# Altium integrated library WCAP-ATG5_rev15a.intlib: 201 symbols (part 3 of 3)
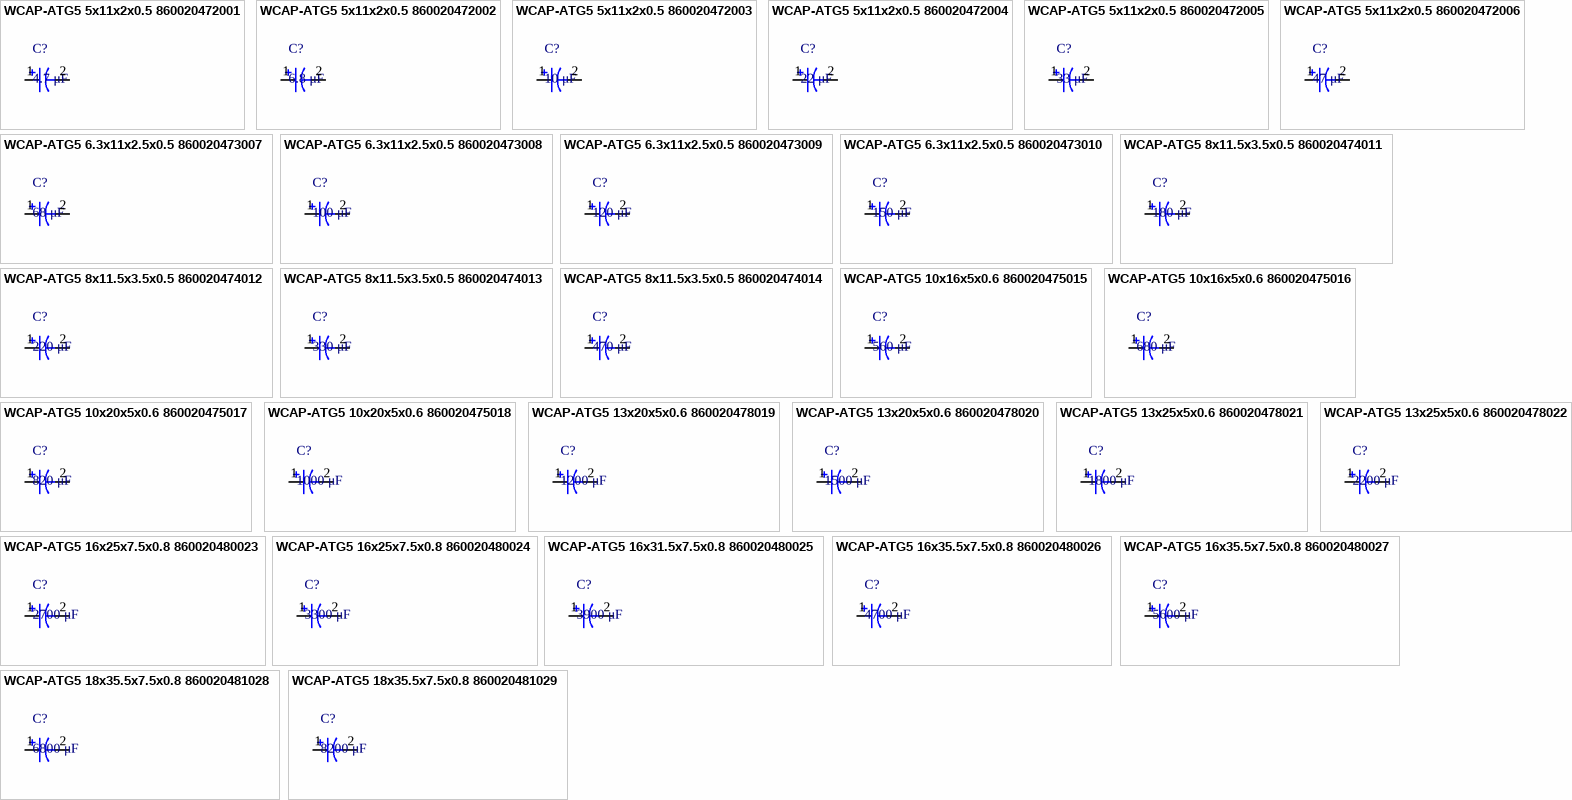
[diagram p8: symbols WCAP-ATG5 5x11x2x0.5 860020472001 to WCAP-ATG5 18x35.5x7.5x0.8 860020481029]

## WCAP-ATG5 6.3x11x2.5x0.5 860020473010
designator C?, comment 150 μF
WCAP-ATG5 Aluminum Electrolytic Capacitors , 150 μF; + / - 20%; 25 V , 6,3 x 11; Manufacturer: Wurth Elektronik; partNo: 860020473010; E-mail: libraries@we-online.com; Characteristics: Aluminum Electrolytic Capacitor; Recommended soldering: Wave; Operating temperature:–40 °C to +105 °C for UR < 400 V; –25 °C to +105 °C for UR ≥ 400 V; General purpose product series with max. temperature of +105 °C; Load life: 2000 h @ +105 °C; ComponentLink1Description: Manufacturer; ComponentLink1URL: http://www.we-online.com; ComponentLink2Description: Datasheet; ComponentLink2URL: http://katalog.we-online.de/pbs/datasheet/860020473010.pdf; Created by: Karrer Zheng; Created Date: 6/8/2015; Capacitance: 150 μF; Application: Medium and high voltage type range from 160V-450V used as primary side input filter in power supply; Low voltage type used as energy storage or low frequency filtering in circuit, applied to general switching power supply, AC-DC converter, adapter, charger, TV, VCR, DC motor circuit filter, digital audio, digital cameras, digital video cameras, satellite receiver etc.
footprint WCAP-ATG5 6.3x11x2.5x0.5
pins: 1, 2

## WCAP-ATG5 8x11.5x3.5x0.5 860020474011
designator C?, comment 180 μF
WCAP-ATG5 Aluminum Electrolytic Capacitors , 180 μF; + / - 20%; 25 V , 8 x 11,5; Manufacturer: Wurth Elektronik; partNo: 860020474011; E-mail: libraries@we-online.com; Characteristics: Aluminum Electrolytic Capacitor; Recommended soldering: Wave; Operating temperature:–40 °C to +105 °C for UR < 400 V; –25 °C to +105 °C for UR ≥ 400 V; General purpose product series with max. temperature of +105 °C; Load life: 2000 h @ +105 °C; ComponentLink1Description: Manufacturer; ComponentLink1URL: http://www.we-online.com; ComponentLink2Description: Datasheet; ComponentLink2URL: http://katalog.we-online.de/pbs/datasheet/860020474011.pdf; Created by: Karrer Zheng; Created Date: 6/8/2015; Capacitance: 180 μF; Application: Medium and high voltage type range from 160V-450V used as primary side input filter in power supply; Low voltage type used as energy storage or low frequency filtering in circuit, applied to general switching power supply, AC-DC converter, adapter, charger, TV, VCR, DC motor circuit filter, digital audio, digital cameras, digital video cameras, satellite receiver etc.
footprint WCAP-ATG5 8x11.5x3.5x0.5
pins: 1, 2

## WCAP-ATG5 8x11.5x3.5x0.5 860020474012
designator C?, comment 220 μF
WCAP-ATG5 Aluminum Electrolytic Capacitors , 220 μF; + / - 20%; 25 V , 8 x 11,5; Manufacturer: Wurth Elektronik; partNo: 860020474012; E-mail: libraries@we-online.com; Characteristics: Aluminum Electrolytic Capacitor; Recommended soldering: Wave; Operating temperature:–40 °C to +105 °C for UR < 400 V; –25 °C to +105 °C for UR ≥ 400 V; General purpose product series with max. temperature of +105 °C; Load life: 2000 h @ +105 °C; ComponentLink1Description: Manufacturer; ComponentLink1URL: http://www.we-online.com; ComponentLink2Description: Datasheet; ComponentLink2URL: http://katalog.we-online.de/pbs/datasheet/860020474012.pdf; Created by: Karrer Zheng; Created Date: 6/8/2015; Capacitance: 220 μF; Application: Medium and high voltage type range from 160V-450V used as primary side input filter in power supply; Low voltage type used as energy storage or low frequency filtering in circuit, applied to general switching power supply, AC-DC converter, adapter, charger, TV, VCR, DC motor circuit filter, digital audio, digital cameras, digital video cameras, satellite receiver etc.
footprint WCAP-ATG5 8x11.5x3.5x0.5
pins: 1, 2

## WCAP-ATG5 8x11.5x3.5x0.5 860020474013
designator C?, comment 330 μF
WCAP-ATG5 Aluminum Electrolytic Capacitors , 330 μF; + / - 20%; 25 V , 8 x 11,5; Manufacturer: Wurth Elektronik; partNo: 860020474013; E-mail: libraries@we-online.com; Characteristics: Aluminum Electrolytic Capacitor; Recommended soldering: Wave; Operating temperature:–40 °C to +105 °C for UR < 400 V; –25 °C to +105 °C for UR ≥ 400 V; General purpose product series with max. temperature of +105 °C; Load life: 2000 h @ +105 °C; ComponentLink1Description: Manufacturer; ComponentLink1URL: http://www.we-online.com; ComponentLink2Description: Datasheet; ComponentLink2URL: http://katalog.we-online.de/pbs/datasheet/860020474013.pdf; Created by: Karrer Zheng; Created Date: 6/8/2015; Capacitance: 330 μF; Application: Medium and high voltage type range from 160V-450V used as primary side input filter in power supply; Low voltage type used as energy storage or low frequency filtering in circuit, applied to general switching power supply, AC-DC converter, adapter, charger, TV, VCR, DC motor circuit filter, digital audio, digital cameras, digital video cameras, satellite receiver etc.
footprint WCAP-ATG5 8x11.5x3.5x0.5
pins: 1, 2

## WCAP-ATG5 8x11.5x3.5x0.5 860020474014
designator C?, comment 470 μF
WCAP-ATG5 Aluminum Electrolytic Capacitors , 470 μF; + / - 20%; 25 V , 8 x 11,5; Manufacturer: Wurth Elektronik; partNo: 860020474014; E-mail: libraries@we-online.com; Characteristics: Aluminum Electrolytic Capacitor; Recommended soldering: Wave; Operating temperature:–40 °C to +105 °C for UR < 400 V; –25 °C to +105 °C for UR ≥ 400 V; General purpose product series with max. temperature of +105 °C; Load life: 2000 h @ +105 °C; ComponentLink1Description: Manufacturer; ComponentLink1URL: http://www.we-online.com; ComponentLink2Description: Datasheet; ComponentLink2URL: http://katalog.we-online.de/pbs/datasheet/860020474014.pdf; Created by: Karrer Zheng; Created Date: 6/8/2015; Capacitance: 470 μF; Application: Medium and high voltage type range from 160V-450V used as primary side input filter in power supply; Low voltage type used as energy storage or low frequency filtering in circuit, applied to general switching power supply, AC-DC converter, adapter, charger, TV, VCR, DC motor circuit filter, digital audio, digital cameras, digital video cameras, satellite receiver etc.
footprint WCAP-ATG5 8x11.5x3.5x0.5
pins: 1, 2

## WCAP-ATG5 10x16x5x0.6 860020475015
designator C?, comment 560 μF
WCAP-ATG5 Aluminum Electrolytic Capacitors , 560 μF; + / - 20%; 25 V , 10 x 16; Manufacturer: Wurth Elektronik; partNo: 860020475015; E-mail: libraries@we-online.com; Characteristics: Aluminum Electrolytic Capacitor; Recommended soldering: Wave; Operating temperature:–40 °C to +105 °C for UR < 400 V; –25 °C to +105 °C for UR ≥ 400 V; General purpose product series with max. temperature of +105 °C; Load life: 2000 h @ +105 °C; ComponentLink1Description: Manufacturer; ComponentLink1URL: http://www.we-online.com; ComponentLink2Description: Datasheet; ComponentLink2URL: http://katalog.we-online.de/pbs/datasheet/860020475015.pdf; Created by: Karrer Zheng; Created Date: 6/8/2015; Capacitance: 560 μF; Application: Medium and high voltage type range from 160V-450V used as primary side input filter in power supply; Low voltage type used as energy storage or low frequency filtering in circuit, applied to general switching power supply, AC-DC converter, adapter, charger, TV, VCR, DC motor circuit filter, digital audio, digital cameras, digital video cameras, satellite receiver etc.
footprint WCAP-ATG5 10x16x5x0.6
pins: 1, 2

## WCAP-ATG5 10x16x5x0.6 860020475016
designator C?, comment 680 μF
WCAP-ATG5 Aluminum Electrolytic Capacitors , 680 μF; + / - 20%; 25 V , 10 x 16; Manufacturer: Wurth Elektronik; partNo: 860020475016; E-mail: libraries@we-online.com; Characteristics: Aluminum Electrolytic Capacitor; Recommended soldering: Wave; Operating temperature:–40 °C to +105 °C for UR < 400 V; –25 °C to +105 °C for UR ≥ 400 V; General purpose product series with max. temperature of +105 °C; Load life: 2000 h @ +105 °C; ComponentLink1Description: Manufacturer; ComponentLink1URL: http://www.we-online.com; ComponentLink2Description: Datasheet; ComponentLink2URL: http://katalog.we-online.de/pbs/datasheet/860020475016.pdf; Created by: Karrer Zheng; Created Date: 6/8/2015; Capacitance: 680 μF; Application: Medium and high voltage type range from 160V-450V used as primary side input filter in power supply; Low voltage type used as energy storage or low frequency filtering in circuit, applied to general switching power supply, AC-DC converter, adapter, charger, TV, VCR, DC motor circuit filter, digital audio, digital cameras, digital video cameras, satellite receiver etc.
footprint WCAP-ATG5 10x16x5x0.6
pins: 1, 2

## WCAP-ATG5 10x20x5x0.6 860020475017
designator C?, comment 820 μF
WCAP-ATG5 Aluminum Electrolytic Capacitors , 820 μF; + / - 20%; 25 V , 10 x 20; Manufacturer: Wurth Elektronik; partNo: 860020475017; E-mail: libraries@we-online.com; Characteristics: Aluminum Electrolytic Capacitor; Recommended soldering: Wave; Operating temperature:–40 °C to +105 °C for UR < 400 V; –25 °C to +105 °C for UR ≥ 400 V; General purpose product series with max. temperature of +105 °C; Load life: 2000 h @ +105 °C; ComponentLink1Description: Manufacturer; ComponentLink1URL: http://www.we-online.com; ComponentLink2Description: Datasheet; ComponentLink2URL: http://katalog.we-online.de/pbs/datasheet/860020475017.pdf; Created by: Karrer Zheng; Created Date: 6/8/2015; Capacitance: 820 μF; Application: Medium and high voltage type range from 160V-450V used as primary side input filter in power supply; Low voltage type used as energy storage or low frequency filtering in circuit, applied to general switching power supply, AC-DC converter, adapter, charger, TV, VCR, DC motor circuit filter, digital audio, digital cameras, digital video cameras, satellite receiver etc.
footprint WCAP-ATG5 10x20x5x0.6
pins: 1, 2

## WCAP-ATG5 10x20x5x0.6 860020475018
designator C?, comment 1000 μF
WCAP-ATG5 Aluminum Electrolytic Capacitors , 1000 μF; + / - 20%; 25 V , 10 x 20; Manufacturer: Wurth Elektronik; partNo: 860020475018; E-mail: libraries@we-online.com; Characteristics: Aluminum Electrolytic Capacitor; Recommended soldering: Wave; Operating temperature:–40 °C to +105 °C for UR < 400 V; –25 °C to +105 °C for UR ≥ 400 V; General purpose product series with max. temperature of +105 °C; Load life: 2000 h @ +105 °C; ComponentLink1Description: Manufacturer; ComponentLink1URL: http://www.we-online.com; ComponentLink2Description: Datasheet; ComponentLink2URL: http://katalog.we-online.de/pbs/datasheet/860020475018.pdf; Created by: Karrer Zheng; Created Date: 6/8/2015; Capacitance: 1000 μF; Application: Medium and high voltage type range from 160V-450V used as primary side input filter in power supply; Low voltage type used as energy storage or low frequency filtering in circuit, applied to general switching power supply, AC-DC converter, adapter, charger, TV, VCR, DC motor circuit filter, digital audio, digital cameras, digital video cameras, satellite receiver etc.
footprint WCAP-ATG5 10x20x5x0.6
pins: 1, 2

## WCAP-ATG5 13x20x5x0.6 860020478019
designator C?, comment 1200 μF
WCAP-ATG5 Aluminum Electrolytic Capacitors , 1200 μF; + / - 20%; 25 V , 13 x 20; Manufacturer: Wurth Elektronik; partNo: 860020478019; E-mail: libraries@we-online.com; Characteristics: Aluminum Electrolytic Capacitor; Recommended soldering: Wave; Operating temperature:–40 °C to +105 °C for UR < 400 V; –25 °C to +105 °C for UR ≥ 400 V; General purpose product series with max. temperature of +105 °C; Load life: 2000 h @ +105 °C; ComponentLink1Description: Manufacturer; ComponentLink1URL: http://www.we-online.com; ComponentLink2Description: Datasheet; ComponentLink2URL: http://katalog.we-online.de/pbs/datasheet/860020478019.pdf; Created by: Karrer Zheng; Created Date: 6/8/2015; Capacitance: 1200 μF; Application: Medium and high voltage type range from 160V-450V used as primary side input filter in power supply; Low voltage type used as energy storage or low frequency filtering in circuit, applied to general switching power supply, AC-DC converter, adapter, charger, TV, VCR, DC motor circuit filter, digital audio, digital cameras, digital video cameras, satellite receiver etc.
footprint WCAP-ATG5 13x20x5x0.6
pins: 1, 2

## WCAP-ATG5 13x20x5x0.6 860020478020
designator C?, comment 1500 μF
WCAP-ATG5 Aluminum Electrolytic Capacitors , 1500 μF; + / - 20%; 25 V , 13 x 20; Manufacturer: Wurth Elektronik; partNo: 860020478020; E-mail: libraries@we-online.com; Characteristics: Aluminum Electrolytic Capacitor; Recommended soldering: Wave; Operating temperature:–40 °C to +105 °C for UR < 400 V; –25 °C to +105 °C for UR ≥ 400 V; General purpose product series with max. temperature of +105 °C; Load life: 2000 h @ +105 °C; ComponentLink1Description: Manufacturer; ComponentLink1URL: http://www.we-online.com; ComponentLink2Description: Datasheet; ComponentLink2URL: http://katalog.we-online.de/pbs/datasheet/860020478020.pdf; Created by: Karrer Zheng; Created Date: 6/8/2015; Capacitance: 1500 μF; Application: Medium and high voltage type range from 160V-450V used as primary side input filter in power supply; Low voltage type used as energy storage or low frequency filtering in circuit, applied to general switching power supply, AC-DC converter, adapter, charger, TV, VCR, DC motor circuit filter, digital audio, digital cameras, digital video cameras, satellite receiver etc.
footprint WCAP-ATG5 13x20x5x0.6
pins: 1, 2

## WCAP-ATG5 13x25x5x0.6 860020478021
designator C?, comment 1800 μF
WCAP-ATG5 Aluminum Electrolytic Capacitors , 1800 μF; + / - 20%; 25 V , 13 x 25; Manufacturer: Wurth Elektronik; partNo: 860020478021; E-mail: libraries@we-online.com; Characteristics: Aluminum Electrolytic Capacitor; Recommended soldering: Wave; Operating temperature:–40 °C to +105 °C for UR < 400 V; –25 °C to +105 °C for UR ≥ 400 V; General purpose product series with max. temperature of +105 °C; Load life: 2000 h @ +105 °C; ComponentLink1Description: Manufacturer; ComponentLink1URL: http://www.we-online.com; ComponentLink2Description: Datasheet; ComponentLink2URL: http://katalog.we-online.de/pbs/datasheet/860020478021.pdf; Created by: Karrer Zheng; Created Date: 6/8/2015; Capacitance: 1800 μF; Application: Medium and high voltage type range from 160V-450V used as primary side input filter in power supply; Low voltage type used as energy storage or low frequency filtering in circuit, applied to general switching power supply, AC-DC converter, adapter, charger, TV, VCR, DC motor circuit filter, digital audio, digital cameras, digital video cameras, satellite receiver etc.
footprint WCAP-ATG5 13x25x5x0.6
pins: 1, 2

## WCAP-ATG5 13x25x5x0.6 860020478022
designator C?, comment 2200 μF
WCAP-ATG5 Aluminum Electrolytic Capacitors , 2200 μF; + / - 20%; 25 V , 13 x 25; Manufacturer: Wurth Elektronik; partNo: 860020478022; E-mail: libraries@we-online.com; Characteristics: Aluminum Electrolytic Capacitor; Recommended soldering: Wave; Operating temperature:–40 °C to +105 °C for UR < 400 V; –25 °C to +105 °C for UR ≥ 400 V; General purpose product series with max. temperature of +105 °C; Load life: 2000 h @ +105 °C; ComponentLink1Description: Manufacturer; ComponentLink1URL: http://www.we-online.com; ComponentLink2Description: Datasheet; ComponentLink2URL: http://katalog.we-online.de/pbs/datasheet/860020478022.pdf; Created by: Karrer Zheng; Created Date: 6/8/2015; Capacitance: 2200 μF; Application: Medium and high voltage type range from 160V-450V used as primary side input filter in power supply; Low voltage type used as energy storage or low frequency filtering in circuit, applied to general switching power supply, AC-DC converter, adapter, charger, TV, VCR, DC motor circuit filter, digital audio, digital cameras, digital video cameras, satellite receiver etc.
footprint WCAP-ATG5 13x25x5x0.6
pins: 1, 2

## WCAP-ATG5 16x25x7.5x0.8 860020480023
designator C?, comment 2700 μF
WCAP-ATG5 Aluminum Electrolytic Capacitors , 2700 μF; + / - 20%; 25 V , 16 x 25; Manufacturer: Wurth Elektronik; partNo: 860020480023; E-mail: libraries@we-online.com; Characteristics: Aluminum Electrolytic Capacitor; Recommended soldering: Wave; Operating temperature:–40 °C to +105 °C for UR < 400 V; –25 °C to +105 °C for UR ≥ 400 V; General purpose product series with max. temperature of +105 °C; Load life: 2000 h @ +105 °C; ComponentLink1Description: Manufacturer; ComponentLink1URL: http://www.we-online.com; ComponentLink2Description: Datasheet; ComponentLink2URL: http://katalog.we-online.de/pbs/datasheet/860020480023.pdf; Created by: Karrer Zheng; Created Date: 6/8/2015; Capacitance: 2700 μF; Application: Medium and high voltage type range from 160V-450V used as primary side input filter in power supply; Low voltage type used as energy storage or low frequency filtering in circuit, applied to general switching power supply, AC-DC converter, adapter, charger, TV, VCR, DC motor circuit filter, digital audio, digital cameras, digital video cameras, satellite receiver etc.
footprint WCAP-ATG5 16x25x7.5x0.8
pins: 1, 2

## WCAP-ATG5 16x25x7.5x0.8 860020480024
designator C?, comment 3300 μF
WCAP-ATG5 Aluminum Electrolytic Capacitors , 3300 μF; + / - 20%; 25 V , 16 x 25; Manufacturer: Wurth Elektronik; partNo: 860020480024; E-mail: libraries@we-online.com; Characteristics: Aluminum Electrolytic Capacitor; Recommended soldering: Wave; Operating temperature:–40 °C to +105 °C for UR < 400 V; –25 °C to +105 °C for UR ≥ 400 V; General purpose product series with max. temperature of +105 °C; Load life: 2000 h @ +105 °C; ComponentLink1Description: Manufacturer; ComponentLink1URL: http://www.we-online.com; ComponentLink2Description: Datasheet; ComponentLink2URL: http://katalog.we-online.de/pbs/datasheet/860020480024.pdf; Created by: Karrer Zheng; Created Date: 6/8/2015; Capacitance: 3300 μF; Application: Medium and high voltage type range from 160V-450V used as primary side input filter in power supply; Low voltage type used as energy storage or low frequency filtering in circuit, applied to general switching power supply, AC-DC converter, adapter, charger, TV, VCR, DC motor circuit filter, digital audio, digital cameras, digital video cameras, satellite receiver etc.
footprint WCAP-ATG5 16x25x7.5x0.8
pins: 1, 2

## WCAP-ATG5 16x31.5x7.5x0.8 860020480025
designator C?, comment 3900 μF
WCAP-ATG5 Aluminum Electrolytic Capacitors , 3900 μF; + / - 20%; 25 V , 16 x 31,5; Manufacturer: Wurth Elektronik; partNo: 860020480025; E-mail: libraries@we-online.com; Characteristics: Aluminum Electrolytic Capacitor; Recommended soldering: Wave; Operating temperature:–40 °C to +105 °C for UR < 400 V; –25 °C to +105 °C for UR ≥ 400 V; General purpose product series with max. temperature of +105 °C; Load life: 2000 h @ +105 °C; ComponentLink1Description: Manufacturer; ComponentLink1URL: http://www.we-online.com; ComponentLink2Description: Datasheet; ComponentLink2URL: http://katalog.we-online.de/pbs/datasheet/860020480025.pdf; Created by: Karrer Zheng; Created Date: 6/8/2015; Capacitance: 3900 μF; Application: Medium and high voltage type range from 160V-450V used as primary side input filter in power supply; Low voltage type used as energy storage or low frequency filtering in circuit, applied to general switching power supply, AC-DC converter, adapter, charger, TV, VCR, DC motor circuit filter, digital audio, digital cameras, digital video cameras, satellite receiver etc.
footprint WCAP-ATG5 16x31.5x7.5x0.8
pins: 1, 2

## WCAP-ATG5 16x35.5x7.5x0.8 860020480026
designator C?, comment 4700 μF
WCAP-ATG5 Aluminum Electrolytic Capacitors , 4700 μF; + / - 20%; 25 V , 16 x 35,5; Manufacturer: Wurth Elektronik; partNo: 860020480026; E-mail: libraries@we-online.com; Characteristics: Aluminum Electrolytic Capacitor; Recommended soldering: Wave; Operating temperature:–40 °C to +105 °C for UR < 400 V; –25 °C to +105 °C for UR ≥ 400 V; General purpose product series with max. temperature of +105 °C; Load life: 2000 h @ +105 °C; ComponentLink1Description: Manufacturer; ComponentLink1URL: http://www.we-online.com; ComponentLink2Description: Datasheet; ComponentLink2URL: http://katalog.we-online.de/pbs/datasheet/860020480026.pdf; Created by: Karrer Zheng; Created Date: 6/8/2015; Capacitance: 4700 μF; Application: Medium and high voltage type range from 160V-450V used as primary side input filter in power supply; Low voltage type used as energy storage or low frequency filtering in circuit, applied to general switching power supply, AC-DC converter, adapter, charger, TV, VCR, DC motor circuit filter, digital audio, digital cameras, digital video cameras, satellite receiver etc.
footprint WCAP-ATG5 16x35.5x7.5x0.8
pins: 1, 2

## WCAP-ATG5 16x35.5x7.5x0.8 860020480027
designator C?, comment 5600 μF
WCAP-ATG5 Aluminum Electrolytic Capacitors , 5600 μF; + / - 20%; 25 V , 16 x 35,5; Manufacturer: Wurth Elektronik; partNo: 860020480027; E-mail: libraries@we-online.com; Characteristics: Aluminum Electrolytic Capacitor; Recommended soldering: Wave; Operating temperature:–40 °C to +105 °C for UR < 400 V; –25 °C to +105 °C for UR ≥ 400 V; General purpose product series with max. temperature of +105 °C; Load life: 2000 h @ +105 °C; ComponentLink1Description: Manufacturer; ComponentLink1URL: http://www.we-online.com; ComponentLink2Description: Datasheet; ComponentLink2URL: http://katalog.we-online.de/pbs/datasheet/860020480027.pdf; Created by: Karrer Zheng; Created Date: 6/8/2015; Capacitance: 5600 μF; Application: Medium and high voltage type range from 160V-450V used as primary side input filter in power supply; Low voltage type used as energy storage or low frequency filtering in circuit, applied to general switching power supply, AC-DC converter, adapter, charger, TV, VCR, DC motor circuit filter, digital audio, digital cameras, digital video cameras, satellite receiver etc.
footprint WCAP-ATG5 16x35.5x7.5x0.8
pins: 1, 2

## WCAP-ATG5 18x35.5x7.5x0.8 860020481028
designator C?, comment 6800 μF
WCAP-ATG5 Aluminum Electrolytic Capacitors , 6800 μF; + / - 20%; 25 V , 18 x 35,5; Manufacturer: Wurth Elektronik; partNo: 860020481028; E-mail: libraries@we-online.com; Characteristics: Aluminum Electrolytic Capacitor; Recommended soldering: Wave; Operating temperature:–40 °C to +105 °C for UR < 400 V; –25 °C to +105 °C for UR ≥ 400 V; General purpose product series with max. temperature of +105 °C; Load life: 2000 h @ +105 °C; ComponentLink1Description: Manufacturer; ComponentLink1URL: http://www.we-online.com; ComponentLink2Description: Datasheet; ComponentLink2URL: http://katalog.we-online.de/pbs/datasheet/860020481028.pdf; Created by: Karrer Zheng; Created Date: 6/8/2015; Capacitance: 6800 μF; Application: Medium and high voltage type range from 160V-450V used as primary side input filter in power supply; Low voltage type used as energy storage or low frequency filtering in circuit, applied to general switching power supply, AC-DC converter, adapter, charger, TV, VCR, DC motor circuit filter, digital audio, digital cameras, digital video cameras, satellite receiver etc.
footprint WCAP-ATG5 18x35.5x7.5x0.8
pins: 1, 2

## WCAP-ATG5 18x35.5x7.5x0.8 860020481029
designator C?, comment 8200 μF
WCAP-ATG5 Aluminum Electrolytic Capacitors , 8200 μF; + / - 20%; 25 V , 18 x 35,5; Manufacturer: Wurth Elektronik; partNo: 860020481029; E-mail: libraries@we-online.com; Characteristics: Aluminum Electrolytic Capacitor; Recommended soldering: Wave; Operating temperature:–40 °C to +105 °C for UR < 400 V; –25 °C to +105 °C for UR ≥ 400 V; General purpose product series with max. temperature of +105 °C; Load life: 2000 h @ +105 °C; ComponentLink1Description: Manufacturer; ComponentLink1URL: http://www.we-online.com; ComponentLink2Description: Datasheet; ComponentLink2URL: http://katalog.we-online.de/pbs/datasheet/860020481029.pdf; Created by: Karrer Zheng; Created Date: 6/8/2015; Capacitance: 8200 μF; Application: Medium and high voltage type range from 160V-450V used as primary side input filter in power supply; Low voltage type used as energy storage or low frequency filtering in circuit, applied to general switching power supply, AC-DC converter, adapter, charger, TV, VCR, DC motor circuit filter, digital audio, digital cameras, digital video cameras, satellite receiver etc.
footprint WCAP-ATG5 18x35.5x7.5x0.8
pins: 1, 2